# Altium footprint library Binh.PcbLib: 863 footprints (part 41 of 54)
Each footprint in its own frame and in the unit in brackets; x right, y up, seen from the top. Pads: shape width x height; smd on the part's side, far side on the other; paste and mask are expansions set on the pad; w line width, h text height; cw(c..) or ccw(c..) is an arc to the next point about the centre after c.
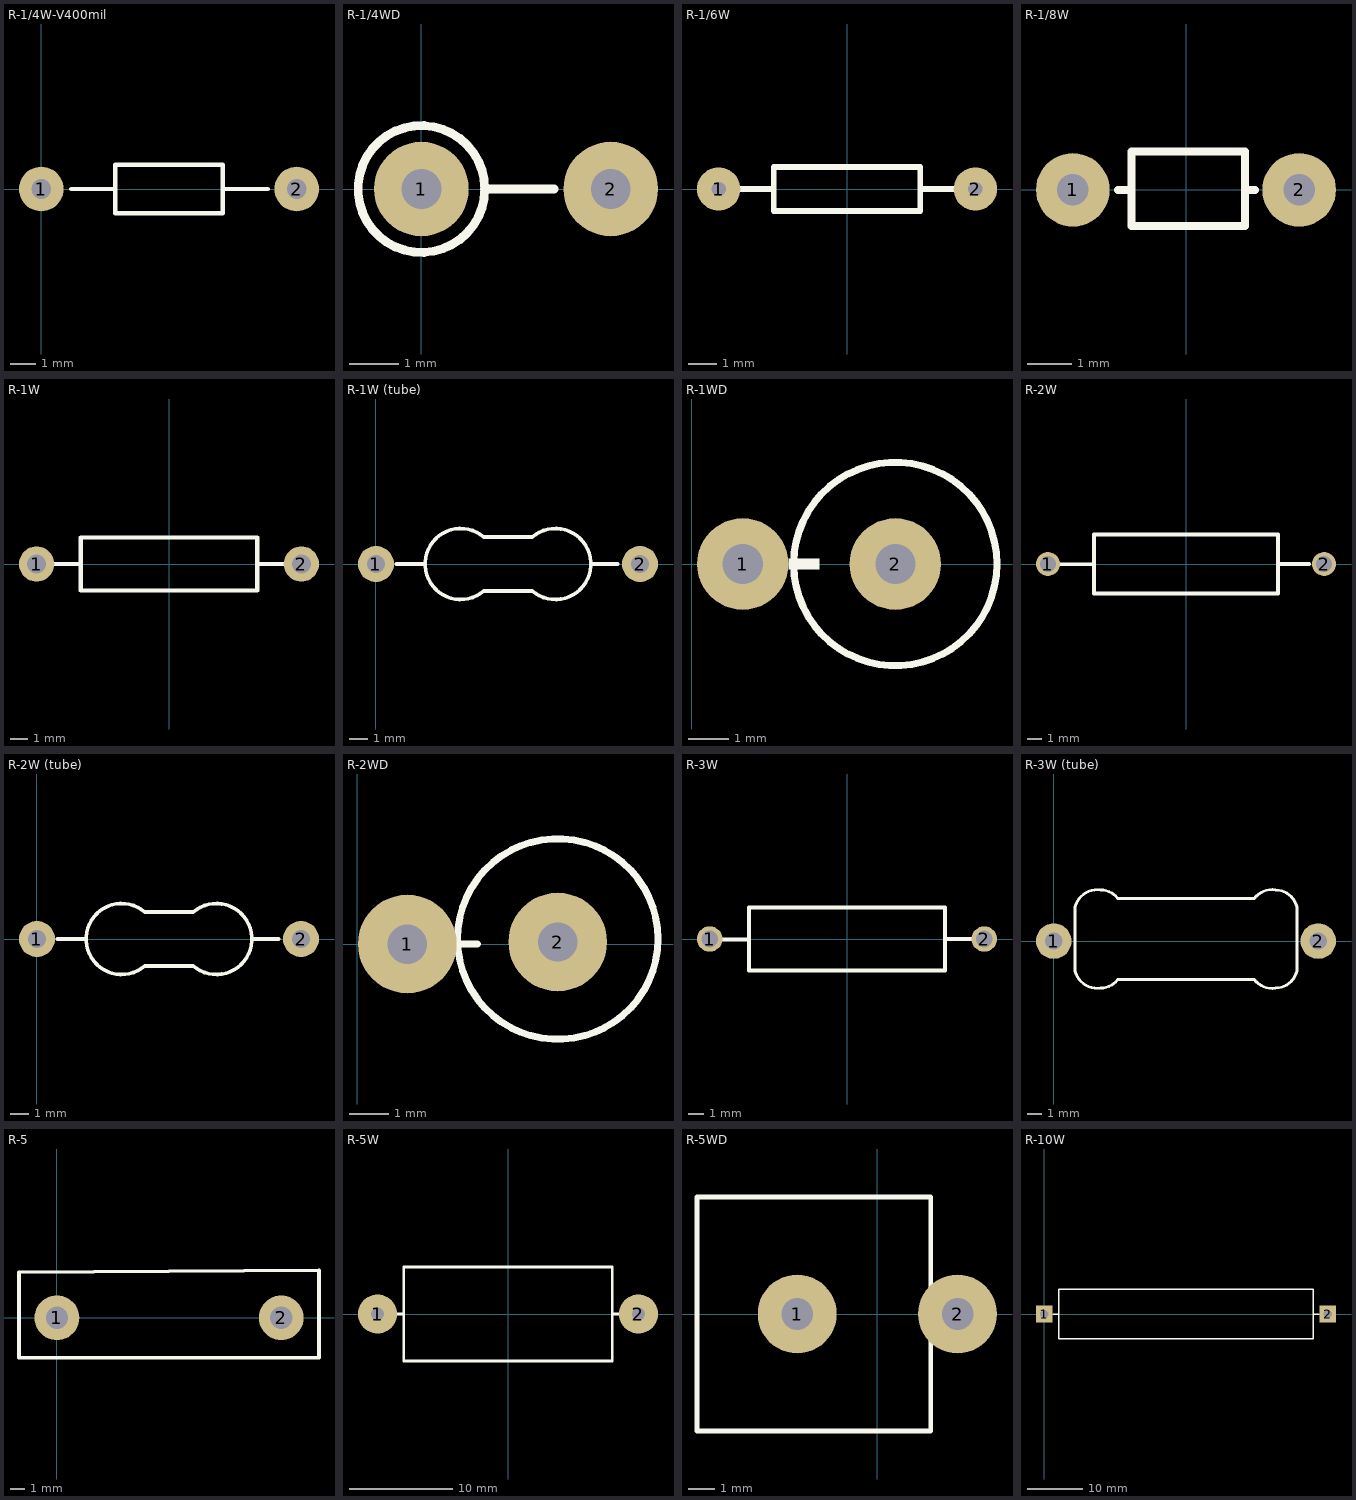
[diagram p40: the footprints below, top view; thin cyan lines are the x and y axes]

## R-1/4W-V400mil [mil] "R 1/4W, 2 Pin, 400mil"
height 100
pads (2):
  round 70 hole 31: 1(0,0) 2(400,0)
Top Overlay:
  lines w7: 47,0 116,0 ; 284,0 355,0 ; 116,-38 116,38 284,38 284,-38 116,-38
3D body "SW3dPS-RESISTOR, 0.25 W, 0.4 IN LEAD PITCH.STEP": height 115.5, standoff -100, extent -12,-45 412,46

## R-1/4WD [mm] "R 1/4W, 2 Pin, 150mil"
height 2.54
pads (2):
  round 1.905 hole 0.8: 1(0,0) 2(3.81,0)
Top Overlay:
  circle w0.178: c0,0 r1.276
  lines w0.178: 1.27,0 2.667,0
3D body "SW3DPS-0_5W METAL FILM RESISTOR-DEFAULT.STEP": height 13.42, standoff -4.28, extent -1.778,-1.7 4.322,1.7

## R-1/6W [mm]
height 1.524
pads (2):
  round 1.5 hole 0.5: 1(-4.445,0) 2(4.445,0)
Top Overlay:
  lines w0.2: -3.81,0 -2.54,0 ; 3.81,0 2.54,0 ; 2.54,0 2.54,-0.762 -2.54,-0.762 -2.54,0.762 2.54,0.762 2.54,0

## R-1/8W [mil] "R 1/8W, 2 pin, 300mil"
height 100
pads (2):
  round 65 hole 28: 1(-100,0) 2(100,0)
Top Overlay:
  lines w7: -60,0 -48,0 ; 54,0 61,0 ; -48,-32 -48,34 52,34 52,-32 -48,-32
3D body "SW3dPS-Res_Normal (0.25W).STEP": height 86.31, standoff -68.11, extent -135,-35.48 135,37

## R-1W [mil] "dien tro 1W"
pads (2):
  round 80 hole 43.31: 1(-300,0) 2(300,0)
Top Overlay:
  lines w10: -300,0 -200,0 ; 200,0 300,0 ; -200,-60 200,-60 200,60 -200,60 -200,-60

## R-1W (tube) [mm] "Dien tro 1W hinh ong"
pads (2):
  round 2 hole 1: 1(0,0) 2(14.707,0)
Top Overlay:
  lines w0.2: 1.143,0 2.701,0 ; 12.006,0 13.462,0
  lines w0.203: 6.003,-1.501 cw(c4.716,0) 6.003,1.501 8.704,1.501 cw(c9.99,0) 8.704,-1.501 6.003,-1.501
3D body "R_0.25W.STEP": height 1.2, standoff -3.25, extent 2.724,-0.876 13.024,1.524

## R-1WD [mil] "R 1W, 2 pin, 500mil"
height 100
pads (2):
  round 90 hole 39.37: 1(50,0) 2(200,0)
Top Overlay:
  circle w7: c200,0 r100
  region: 125,5 125,-5 95,-5 95,5

## R-2W [mil] "dien tro 2W"
height 10
pads (2):
  round 65 hole 43.31: 1(-375,0) 2(375,0)
Top Overlay:
  lines w10: -340,-1 -250,-1 -250,-80 250,-80 250,80 -250,80 -250,0 -251,-1 ; 250,0 335,0

## R-2W (tube) [mm] "Dien tro 2W hinh ong"
pads (2):
  round 2 hole 1: 1(0,0) 2(14.707,0)
Top Overlay:
  lines w0.2: 1.143,0 2.701,0 ; 12.006,0 13.462,0
  lines w0.203: 6.003,-1.501 cw(c4.716,0) 6.003,1.501 8.704,1.501 cw(c9.99,0) 8.704,-1.501 6.003,-1.501

## R-2WD [mm] "R2W, 2 pin, 700mil"
height 5.08
pads (2):
  round 2.5 hole 1: 1(1.27,0) 2(5.08,0.051)
Top Overlay:
  circle w0.178: c5.08,0.127 r2.54
  lines w0.178: 2.159,0 3.048,0

## R-3W [mil] "dien tro 3W"
pads (2):
  round 65 hole 43.31: 1(-350,0) 2(350,0)
Top Overlay:
  lines w10: -321,-1 -250,-1 -250,-80 250,-80 250,80 -250,80 -250,0 -251,-1 ; 250,0 320,0

## R-3W (tube) [mm] "Dien tro 3W dang ong tru"
pads (2):
  round 2.5 hole 1.2: 1(0,0) 2(18.609,0)
Top Overlay:
  lines w0.2: 3.302,-3.302 cw(c3.062,-1.711) 1.501,-2.101 1.501,2.401 cw(c3.062,2.011) 3.302,3.602 cw(c3.302,2.101) 4.502,3.002 14.107,3.001 cw(c15.357,2.051) 15.607,3.602 cw(c15.586,2.037) 17.108,2.401 17.108,-2.101 cw(c15.586,-1.737) 15.607,-3.302 cw(c15.357,-1.751) 14.107,-2.701 4.502,-2.701 cw(c3.302,-1.801) 3.302,-3.301

## R-5 [mm]
pads (2):
  round 3 hole 1.5 unplated: 1(0,0) 2(15,0)
Top Overlay:
  lines w0.254: -2.54,-2.667 -2.54,3.048 17.526,3.175 17.526,-2.667 -2.54,-2.667

## R-5W [mil] "dien tro 5W"
pads (2):
  round 150 hole 50: 1(-500,0) 2(500,0)
Top Overlay:
  lines w10: -465,0 -400,0 ; 400,0 460,0 ; -400,-180 -400,180 400,180 400,-180 -400,-180

## R-5WD [mm] "R5W , 2 pin, 300 x 600 mil"
height 10.16
pads (2):
  round 3 hole 1.2: 1(-3.048,0) 2(3.048,0)
Top Overlay:
  lines w0.178: -6.858,-4.445 -6.858,4.445 2.032,4.445 2.032,-4.445 -6.858,-4.445
3D body "SW3dPS-5W Res.STEP": height 23.05, standoff -2.4, extent -8.648,-5.08 4.432,4.92

## R-10W [mm]
pads (2):
  rect 3x3 hole 1.5: 1(0,0) 2(50.8,0)
Top Overlay:
  lines w0.254: 1.524,0 2.54,0 ; 48.26,0 49.276,0 ; 2.54,-4.445 2.54,4.445 48.26,4.445 48.26,-4.445 2.54,-4.445
3D body: height 7.62, standoff 0, extent 2.54,-4.445 48.26,4.445